# Altium footprint library LUMI_Standard_Auto_Soldering_LIB.PcbLib: 344 footprints (part 22 of 22)
Each footprint in its own frame and in the unit in brackets; x right, y up, seen from the top. Pads: shape width x height; smd on the part's side, far side on the other; paste and mask are expansions set on the pad; w line width, h text height; cw(c..) or ccw(c..) is an arc to the next point about the centre after c.
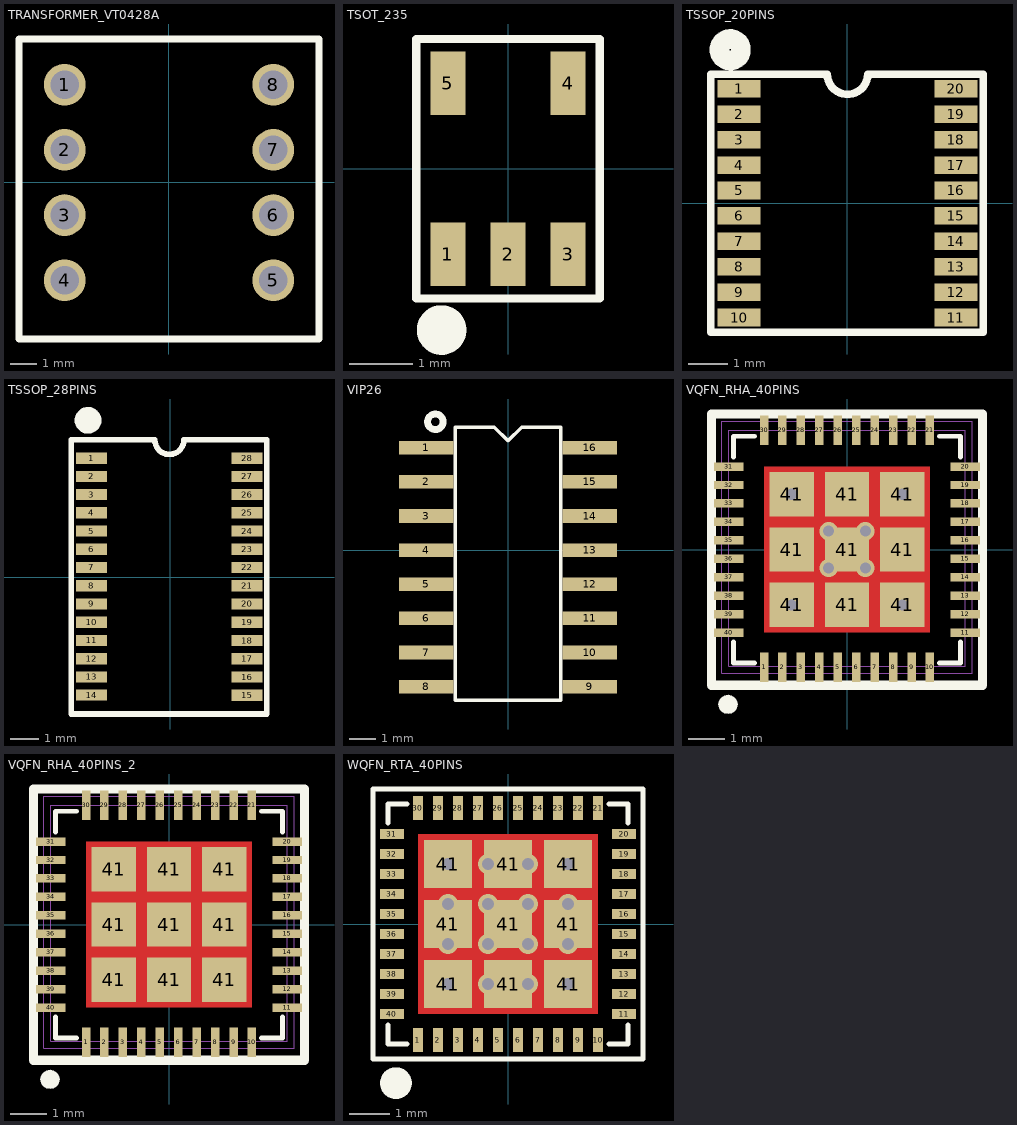
[diagram p21: the footprints below, top view; thin cyan lines are the x and y axes]

## TRANSFORMER_VT0428A [mm]
pads (8):
  round 1.6 hole 1.1 mask+0.07: 1(-4,3.75) 2(-4,1.25) 3(-4,-1.25) 4(-4,-3.75) 5(4,-3.75) 6(4,-1.25) 7(4,1.25) 8(4,3.75)
Top Overlay:
  lines w0.254: -5.75,-6 5.75,-6 5.75,5.5 -5.75,5.5 -5.75,-6
3D body: height 11.5, standoff 0, extent -5.75,-6 5.75,5.5

## TSOT_235 [mm]
pads (5):
  rect 0.55x1 smd mask+0.07: 1(-0.95,-1.35) 2(0,-1.35) 3(0.95,-1.35) 4(0.95,1.35) 5(-0.95,1.35)
Top Overlay:
  circle w0.5: c-1.05,-2.55 r0.141
  lines w0.127: -1.45,-2.05 -1.45,2.05 1.45,2.05 1.45,-2.05 -1.45,-2.05
3D body: height 1.3, standoff 0, extent -1.5,-1.5 1.5,1.5

## TSSOP_20PINS [mm]
pads (20):
  rect 1.1x0.45 smd mask+0: 1(-2.775,2.925) 2(-2.775,2.275) 3(-2.775,1.625) 4(-2.775,0.975) 5(-2.775,0.325) 6(-2.775,-0.325) 7(-2.775,-0.975) 8(-2.775,-1.625) 9(-2.775,-2.275) 10(-2.775,-2.925) 11(2.775,-2.925) 12(2.775,-2.275) 13(2.775,-1.625) 14(2.775,-0.975) 15(2.775,-0.325) 16(2.775,0.325) 17(2.775,0.975) 18(2.775,1.625) 19(2.775,2.275) 20(2.775,2.925)
Top Overlay:
  circle w0.5: c-3,3.925 r0.275
  lines w0.2: -3.5,-3.3 -3.5,3.3 -0.517,3.3 ccw(c0,3.3) 0.517,3.3 3.475,3.3 3.475,-3.3 -3.5,-3.3
3D body: height -0.41, standoff -1.61, extent -3.275,-3.3 3.275,3.3

## TSSOP_28PINS [mm]
pads (28):
  rect 1.1x0.4 smd mask+0: 1(-2.8,4.25) 2(-2.8,3.6) 3(-2.8,2.95) 4(-2.8,2.3) 5(-2.8,1.65) 6(-2.8,1) 7(-2.8,0.35) 8(-2.8,-0.3) 9(-2.8,-0.95) 10(-2.8,-1.6) 11(-2.8,-2.252) 12(-2.8,-2.902) 13(-2.8,-3.552) 14(-2.8,-4.202) 15(2.75,-4.207) 16(2.75,-3.557) 17(2.75,-2.907) 18(2.75,-2.257) 19(2.75,-1.6) 20(2.75,-0.95) 21(2.75,-0.3) 22(2.75,0.35) 23(2.75,1) 24(2.75,1.65) 25(2.75,2.3) 26(2.75,2.95) 27(2.75,3.6) 28(2.75,4.25)
Top Overlay:
  circle w0.5: c-2.925,5.6 r0.225
  lines w0.2: -3.525,-4.875 3.45,-4.875 3.45,4.9 0.491,4.9 cw(c-0.025,4.9) -0.542,4.9 -3.525,4.9 -3.525,-4.875
3D body: height -0.34, standoff -1.33, extent -3.225,-4.8 3.175,4.9

## VIP26 [mil]
pads (16):
  rect 80x20 smd: 1(-120,150) 2(-120,100) 3(-120,50) 4(-120,0) 5(-120,-50) 6(-120,-100) 7(-120,-150) 8(-120,-200) 9(120,-200) 10(120,-150) 11(120,-100) 12(120,-50) 13(120,0) 14(120,50) 15(120,100) 16(120,150)
Top Overlay:
  circle w10: c-106.4,188 r11.4
  lines w5: -77,-220 77,-220 77,180 20,180 0,160 -20,180 -77,180 -77,-220
3D body: height 68.45, standoff -0.98, extent -120.8,-222.52 120.8,170

## VQFN_RHA_40PINS [mm]
pads (49):
  rect 0.23x0.8 smd paste+0 mask+0.07: 1(-2.25,-3.195) 2(-1.75,-3.195) 3(-1.25,-3.195) 4(-0.75,-3.195) 5(-0.25,-3.195) 6(0.25,-3.195) 7(0.75,-3.195) 8(1.25,-3.195) 9(1.75,-3.195) 10(2.25,-3.195) 21(2.25,3.236) 22(1.75,3.236) 23(1.25,3.236) 24(0.75,3.236) 25(0.25,3.236) 26(-0.25,3.236) 27(-0.75,3.236) 28(-1.25,3.236) 29(-1.75,3.236) 30(-2.25,3.236)
  rect 0.8x0.23 smd paste+0 mask+0.07: 11(3.21,-2.25) 12(3.21,-1.75) 13(3.21,-1.25) 14(3.21,-0.75) 15(3.21,-0.25) 16(3.21,0.25) 17(3.21,0.75) 18(3.21,1.25) 19(3.21,1.75) 20(3.21,2.25) 31(-3.21,2.25) 32(-3.21,1.75) 33(-3.21,1.25) 34(-3.21,0.75) 35(-3.21,0.25) 36(-3.21,-0.25) 37(-3.21,-0.75) 38(-3.21,-1.25) 39(-3.21,-1.75) 40(-3.21,-2.25)
  rect 1.2x1.2 smd mask+0.102: 41(-1.5,-1.5) 41(-1.5,0) 41(-1.5,1.5) 41(0,-1.5) 41(0,0) 41(0,1.5) 41(1.5,-1.5) 41(1.5,0) 41(1.5,1.5)
via -1.5,1.5 diameter 0.5 hole 0.3
via 1.5,1.5 diameter 0.5 hole 0.3
via -0.5,0.5 diameter 0.5 hole 0.3
via 0.5,0.5 diameter 0.5 hole 0.3
via -0.5,-0.5 diameter 0.5 hole 0.3
via 0.5,-0.5 diameter 0.5 hole 0.3
via 1.5,-1.5 diameter 0.5 hole 0.3
via -1.5,-1.5 diameter 0.5 hole 0.3
Top Layer:
  rectangle: -2.25,-2.25 2.25,2.25
Top Overlay:
  region: -2.967,-4.2 -2.987,-4.299 -3.043,-4.383 -3.127,-4.439 -3.226,-4.459 -3.325,-4.439 -3.409,-4.383 -3.465,-4.299 -3.485,-4.2 -3.465,-4.1 -3.409,-4.016 -3.325,-3.96 -3.226,-3.941 -3.127,-3.96 -3.043,-4.016 -2.987,-4.1
  lines w0.127: -3.075,-2.5 -3.075,-3.075 -2.5,-3.075 ; -3.075,2.5 -3.075,3.075 -2.5,3.075 ; 2.5,-3.075 3.075,-3.075 3.075,-2.5 ; 2.5,3.075 3.075,3.075 3.075,2.5
  lines w0.254: -3.675,-3.675 3.675,-3.675 3.675,3.675 -3.675,3.675 -3.675,-3.675
Top Solder:
  rectangle: -2.25,-2.25 2.25,2.25
Mechanical 1:
  lines w0.025: -3.21,-3.16 3.2,-3.17 3.2,3.24 -3.21,3.24 -3.21,-3.16
Mechanical 2:
  lines w0.003: -3.4,-3.35 3.4,-3.35 3.4,3.48 -3.4,3.48 -3.4,-3.35
3D body: height 1.03, standoff -0.02, extent -3.075,-3.075 3.075,3.075

## VQFN_RHA_40PINS_2 [mm]
pads (49):
  rect 0.23x0.8 smd paste+0 mask+0.07: 1(-2.25,-3.195) 2(-1.75,-3.195) 3(-1.25,-3.195) 4(-0.75,-3.195) 5(-0.25,-3.195) 6(0.25,-3.195) 7(0.75,-3.195) 8(1.25,-3.195) 9(1.75,-3.195) 10(2.25,-3.195) 21(2.25,3.236) 22(1.75,3.236) 23(1.25,3.236) 24(0.75,3.236) 25(0.25,3.236) 26(-0.25,3.236) 27(-0.75,3.236) 28(-1.25,3.236) 29(-1.75,3.236) 30(-2.25,3.236)
  rect 0.8x0.23 smd paste+0 mask+0.07: 11(3.21,-2.25) 12(3.21,-1.75) 13(3.21,-1.25) 14(3.21,-0.75) 15(3.21,-0.25) 16(3.21,0.25) 17(3.21,0.75) 18(3.21,1.25) 19(3.21,1.75) 20(3.21,2.25) 31(-3.21,2.25) 32(-3.21,1.75) 33(-3.21,1.25) 34(-3.21,0.75) 35(-3.21,0.25) 36(-3.21,-0.25) 37(-3.21,-0.75) 38(-3.21,-1.25) 39(-3.21,-1.75) 40(-3.21,-2.25)
  rect 1.2x1.2 smd mask+0.102: 41(-1.5,-1.5) 41(-1.5,0) 41(-1.5,1.5) 41(0,-1.5) 41(0,0) 41(0,1.5) 41(1.5,-1.5) 41(1.5,0) 41(1.5,1.5)
Top Layer:
  rectangle: -2.25,-2.25 2.25,2.25
Top Overlay:
  region: -2.967,-4.2 -2.987,-4.299 -3.043,-4.383 -3.127,-4.439 -3.226,-4.459 -3.325,-4.439 -3.409,-4.383 -3.465,-4.299 -3.485,-4.2 -3.465,-4.1 -3.409,-4.016 -3.325,-3.96 -3.226,-3.941 -3.127,-3.96 -3.043,-4.016 -2.987,-4.1
  lines w0.127: -3.075,-2.5 -3.075,-3.075 -2.5,-3.075 ; -3.075,2.5 -3.075,3.075 -2.5,3.075 ; 2.5,-3.075 3.075,-3.075 3.075,-2.5 ; 2.5,3.075 3.075,3.075 3.075,2.5
  lines w0.254: -3.675,-3.675 -3.675,3.675 3.675,3.675 3.675,-3.675 -3.675,-3.675
Top Solder:
  rectangle: -2.25,-2.25 2.25,2.25
Mechanical 1:
  lines w0.025: -3.21,-3.16 -3.21,3.24 3.2,3.24 3.2,-3.17 -3.21,-3.16
Mechanical 2:
  lines w0.003: -3.4,-3.35 -3.4,3.48 3.4,3.48 3.4,-3.35 -3.4,-3.35
3D body: height 1.03, standoff -0.02, extent -3.075,-3.075 3.075,3.075

## WQFN_RTA_40PINS [mm]
pads (49):
  rect 0.25x0.6 smd mask+0.07: 1(-2.25,-2.9) 2(-1.75,-2.9) 3(-1.25,-2.9) 4(-0.75,-2.9) 5(-0.25,-2.9) 6(0.25,-2.9) 7(0.75,-2.9) 8(1.25,-2.9) 9(1.75,-2.9) 10(2.25,-2.9) 21(2.25,2.9) 22(1.75,2.9) 23(1.25,2.9) 24(0.75,2.9) 25(0.25,2.9) 26(-0.25,2.9) 27(-0.75,2.9) 28(-1.25,2.9) 29(-1.75,2.9) 30(-2.25,2.9)
  rect 0.6x0.25 smd mask+0.07: 11(2.9,-2.25) 12(2.9,-1.75) 13(2.9,-1.25) 14(2.9,-0.75) 15(2.9,-0.25) 16(2.9,0.25) 17(2.9,0.75) 18(2.9,1.25) 19(2.9,1.75) 20(2.9,2.25) 31(-2.9,2.25) 32(-2.9,1.75) 33(-2.9,1.25) 34(-2.9,0.75) 35(-2.9,0.25) 36(-2.9,-0.25) 37(-2.9,-0.75) 38(-2.9,-1.25) 39(-2.9,-1.75) 40(-2.9,-2.25)
  rect 1.2x1.2 smd mask+0.102: 41(-1.5,-1.5) 41(-1.5,0) 41(-1.5,1.5) 41(0,-1.5) 41(0,0) 41(0,1.5) 41(1.5,-1.5) 41(1.5,0) 41(1.5,1.5)
via -1.5,1.5 diameter 0.5 hole 0.3
via -0.5,1.5 diameter 0.5 hole 0.3
via 0.5,1.5 diameter 0.5 hole 0.3
via 1.5,1.5 diameter 0.5 hole 0.3
via -1.5,0.5 diameter 0.5 hole 0.3
via -0.5,0.5 diameter 0.5 hole 0.3
via 0.5,0.5 diameter 0.5 hole 0.3
via 1.5,0.5 diameter 0.5 hole 0.3
via -1.5,-0.5 diameter 0.5 hole 0.3
via -0.5,-0.5 diameter 0.5 hole 0.3
via 0.5,-0.5 diameter 0.5 hole 0.3
via 1.5,-0.5 diameter 0.5 hole 0.3
via 1.5,-1.5 diameter 0.5 hole 0.3
via 0.5,-1.5 diameter 0.5 hole 0.3
via -0.5,-1.5 diameter 0.5 hole 0.3
via -1.5,-1.5 diameter 0.5 hole 0.3
Top Layer:
  rectangle: -2.25,-2.25 2.25,2.25
Top Overlay:
  circle w0.5: c-2.8,-3.975 r0.146
  lines w0.127: -3,-2.525 -3,-3 -2.525,-3 ; -3,2.525 -3,3 -2.525,3 ; 2.525,-3 3,-3 3,-2.525 ; 2.525,3 3,3 3,2.525 ; -3.375,-3.375 -3.375,3.375 3.375,3.375 3.375,-3.375 -3.375,-3.375
Top Solder:
  rectangle: -2.25,-2.25 2.25,2.25
3D body: height 1.03, standoff -0.02, extent -3.075,-3.075 3.075,3.075